# Altium integrated library CONNECTORS - PIN HEADERS.IntLib: 94 symbols (part 1 of 2) (continued)
## PINSTRIP-HDR-SINGLE-11pin
designator J?, comment 9-146285-0  (value not drawn)
11 Pin Header, Single row, 2.54mm pitch, Unshrouded Pin Strip, Vertical; Manufacturer: TE Connectivity; Part Number: 11/40 of 9-146285-0; Pitch: 0.100" (2.54mm); Rows: 1; Mates With (PCB): 5-534237-9; Mates With (Wire housing): 50-57-9011 (MOLEX Part, Uses crimp terminal series 70058, 71851, 70021); Connector Height: 320 mil; Mounting Type: Through Hole; PackageDescription: Pin header; 2.54mm pitch; Pins: 11; Supplier 1: Digi-Key; Supplier 2: Newark; Supplier 3: Mouser; Supplier Part Number 1: A32700-40-ND; Supplier Part Number 2: 16M3463; Supplier Part Number 3: 571-9-146285-0
footprint PINSTRIP-SINGLE-11PIN-.1 (2.54mm (0.100") Pitch, Through Hole, Single Row, Vertical, 11 pin)
3D model Pinstrip-100mil-SINGLE_HDR-11pin (PCB3D Model)
pins: 1, 2, 3, 4, 5, 6, 7, 8, 9, 10, 11
text: PINSTRIP; HEADER

## PINSTRIP-HDR-SINGLE-12pin
designator J?, comment 9-146285-0  (value not drawn)
12 Pin Header, Single row, 2.54mm pitch, Unshrouded Pin Strip, Vertical; Manufacturer: TE Connectivity; Part Number: 12/40 of 9-146285-0; Pitch: 0.100" (2.54mm); Rows: 1; Mates With (PCB): 6-534237-0; Mates With (Wire housing): 50-57-9012 (MOLEX Part, Uses crimp terminal series 70058, 71851, 70021); Connector Height: 320 mil; Mounting Type: Through Hole; PackageDescription: Pin header; 2.54mm pitch; Pins: 12; Supplier 1: Digi-Key; Supplier 2: Newark; Supplier 3: Mouser; Supplier Part Number 1: A32700-40-ND; Supplier Part Number 2: 16M3463; Supplier Part Number 3: 571-9-146285-0
footprint PINSTRIP-SINGLE-12PIN-.1 (2.54mm (0.100") Pitch, Through Hole, Single Row, Vertical, 12 pin)
3D model Pinstrip-100mil-SINGLE_HDR-12pin (PCB3D Model)
pins: 1, 2, 3, 4, 5, 6, 7, 8, 9, 10, 11, 12
text: HEADER; PINSTRIP

## PINSTRIP-HDR-SINGLE-13pin
designator J?, comment 9-146285-0  (value not drawn)
13 Pin Header, Single row, 2.54mm pitch, Unshrouded Pin Strip, Vertical; Manufacturer: TE Connectivity; Part Number: 13/40 of 9-146285-0; Pitch: 0.100" (2.54mm); Rows: 1; Mates With (PCB): 6-534237-1; Mates With (Wire housing): 50-57-9013 (MOLEX Part, Uses crimp terminal series 70058, 71851, 70021); Connector Height: 320 mil; Mounting Type: Through Hole; PackageDescription: Pin header; 2.54mm pitch; Pins: 13; Supplier 1: Digi-Key; Supplier 2: Newark; Supplier 3: Mouser; Supplier Part Number 1: A32700-40-ND; Supplier Part Number 2: 16M3463; Supplier Part Number 3: 571-9-146285-0
footprint PINSTRIP-SINGLE-13PIN-.1 (2.54mm (0.100") Pitch, Through Hole, Single Row, Vertical, 13 pin)
3D model Pinstrip-100mil-SINGLE_HDR-13pin (PCB3D Model)
pins: 1, 2, 3, 4, 5, 6, 7, 8, 9, 10, 11, 12, 13
text: HEADER; PINSTRIP

## PINSTRIP-HDR-SINGLE-14pin
designator J?, comment 9-146285-0  (value not drawn)
14 Pin Header, Single row, 2.54mm pitch, Unshrouded Pin Strip, Vertical; Manufacturer: TE Connectivity; Part Number: 14/40 of 9-146285-0; Pitch: 0.100" (2.54mm); Rows: 1; Mates With (PCB): 6-534237-2; Mates With (Wire housing): 50-57-9014 (MOLEX Part, Uses crimp terminal series 70058, 71851, 70021); Connector Height: 320 mil; Mounting Type: Through Hole; PackageDescription: Pin header; 2.54mm pitch; Pins: 14; Supplier 1: Digi-Key; Supplier 2: Newark; Supplier 3: Mouser; Supplier Part Number 1: A32700-40-ND; Supplier Part Number 2: 16M3463; Supplier Part Number 3: 571-9-146285-0
footprint PINSTRIP-SINGLE-14PIN-.1 (2.54mm (0.100") Pitch, Through Hole, Single Row, Vertical, 14 pin)
3D model Pinstrip-100mil-SINGLE_HDR-14pin (PCB3D Model)
pins: 1, 2, 3, 4, 5, 6, 7, 8, 9, 10, 11, 12, 13, 14
text: HEADER; PINSTRIP

## PINSTRIP-HDR-SINGLE-15pin
designator J?, comment 9-146285-0  (value not drawn)
15 Pin Header, Single row, 2.54mm pitch, Unshrouded Pin Strip, Vertical; Manufacturer: TE Connectivity; Part Number: 15/40 of 9-146285-0; Pitch: 0.100" (2.54mm); Rows: 1; Mates With (PCB): 6-534237-3; Mates With (Wire housing): 50-57-9015 (MOLEX Part, Uses crimp terminal series 70058, 71851, 70021); Connector Height: 320 mil; Mounting Type: Through Hole; PackageDescription: Pin header; 2.54mm pitch; Pins: 15; Supplier 1: Digi-Key; Supplier 2: Newark; Supplier 3: Mouser; Supplier Part Number 1: A32700-40-ND; Supplier Part Number 2: 16M3463; Supplier Part Number 3: 571-9-146285-0
footprint PINSTRIP-SINGLE-15PIN-.1 (2.54mm (0.100") Pitch, Through Hole, Single Row, Vertical, 15 pin)
3D model Pinstrip-100mil-SINGLE_HDR-15pin (PCB3D Model)
pins: 1, 2, 3, 4, 5, 6, 7, 8, 9, 10, 11, 12, 13, 14, 15
text: HEADER; PINSTRIP

## PINSTRIP-HDR-SINGLE-16pin
designator J?, comment 9-146285-0  (value not drawn)
16 Pin Header, Single row, 2.54mm pitch, Unshrouded Pin Strip, Vertical; Manufacturer: TE Connectivity; Part Number: 16/40 of 9-146285-0; Pitch: 0.100" (2.54mm); Rows: 1; Mates With (PCB): 6-534237-4; Mates With (Wire housing): 50-57-9016 (MOLEX Part, Uses crimp terminal series 70058, 71851, 70021); Connector Height: 320 mil; Mounting Type: Through Hole; PackageDescription: Pin header; 2.54mm pitch; Pins: 16; Supplier 1: Digi-Key; Supplier 2: Newark; Supplier 3: Mouser; Supplier Part Number 1: A32700-40-ND; Supplier Part Number 2: 16M3463; Supplier Part Number 3: 571-9-146285-0
footprint PINSTRIP-SINGLE-16PIN-.1 (2.54mm (0.100") Pitch, Through Hole, Single Row, Vertical, 16 pin)
3D model Pinstrip-100mil-SINGLE_HDR-16pin (PCB3D Model)
pins: 1, 2, 3, 4, 5, 6, 7, 8, 9, 10, 11, 12, 13, 14, 15, 16
text: HEADER; PINSTRIP

## PINSTRIP-HDR-SINGLE-17pin
designator J?, comment 9-146285-0  (value not drawn)
17 Pin Header, Single row, 2.54mm pitch, Unshrouded Pin Strip, Vertical; Manufacturer: TE Connectivity; Part Number: 17/40 of 9-146285-0; Pitch: 0.100" (2.54mm); Rows: 1; Mates With (PCB): 6-534237-5; Mates With (Wire housing): 50-57-9017 (MOLEX Part, Uses crimp terminal series 70058, 71851, 70021); Connector Height: 320 mil; Mounting Type: Through Hole; PackageDescription: Pin header; 2.54mm pitch; Pins: 17; Supplier 1: Digi-Key; Supplier 2: Newark; Supplier 3: Mouser; Supplier Part Number 1: A32700-40-ND; Supplier Part Number 2: 16M3463; Supplier Part Number 3: 571-9-146285-0
footprint PINSTRIP-SINGLE-17PIN-.1 (2.54mm (0.100") Pitch, Through Hole, Single Row, Vertical, 17 pin)
3D model Pinstrip-100mil-SINGLE_HDR-17pin (PCB3D Model)
pins: 1, 2, 3, 4, 5, 6, 7, 8, 9, 10, 11, 12, 13, 14, 15, 16, 17
text: HEADER; PINSTRIP

## PINSTRIP-HDR-SINGLE-18pin
designator J?, comment 9-146285-0  (value not drawn)
18 Pin Header, Single row, 2.54mm pitch, Unshrouded Pin Strip, Vertical; Manufacturer: TE Connectivity; Part Number: 18/40 of 9-146285-0; Pitch: 0.100" (2.54mm); Rows: 1; Mates With (PCB): 6-534237-6; Mates With (Wire housing): 50-57-9018 (MOLEX Part, Uses crimp terminal series 70058, 71851, 70021); Connector Height: 320 mil; Mounting Type: Through Hole; PackageDescription: Pin header; 2.54mm pitch; Pins: 18; Supplier 1: Digi-Key; Supplier 2: Newark; Supplier 3: Mouser; Supplier Part Number 1: A32700-40-ND; Supplier Part Number 2: 16M3463; Supplier Part Number 3: 571-9-146285-0
footprint PINSTRIP-SINGLE-18PIN-.1 (2.54mm (0.100") Pitch, Through Hole, Single Row, Vertical, 18 pin)
3D model Pinstrip-100mil-SINGLE_HDR-18pin (PCB3D Model)
pins: 1, 2, 3, 4, 5, 6, 7, 8, 9, 10, 11, 12, 13, 14, 15, 16, 17, 18
text: HEADER; PINSTRIP

## PINSTRIP-HDR-SINGLE-19pin
designator J?, comment 9-146285-0  (value not drawn)
19 Pin Header, Single row, 2.54mm pitch, Unshrouded Pin Strip, Vertical; Manufacturer: TE Connectivity; Part Number: 19/40 of 9-146285-0; Pitch: 0.100" (2.54mm); Rows: 1; Mates With (PCB): 6-534237-7; Mates With (Wire housing): 50-57-9019 (MOLEX Part, Uses crimp terminal series 70058, 71851, 70021); Connector Height: 320 mil; Mounting Type: Through Hole; PackageDescription: Pin header; 2.54mm pitch; Pins: 19; Supplier 1: Digi-Key; Supplier 2: Newark; Supplier 3: Mouser; Supplier Part Number 1: A32700-40-ND; Supplier Part Number 2: 16M3463; Supplier Part Number 3: 571-9-146285-0
footprint PINSTRIP-SINGLE-19PIN-.1 (2.54mm (0.100") Pitch, Through Hole, Single Row, Vertical, 19 pin)
3D model Pinstrip-100mil-SINGLE_HDR-19pin (PCB3D Model)
pins: 1, 2, 3, 4, 5, 6, 7, 8, 9, 10, 11, 12, 13, 14, 15, 16, 17, 18, 19
text: HEADER; PINSTRIP

## PINSTRIP-HDR-SINGLE-20pin
designator J?, comment 9-146285-0  (value not drawn)
20 Pin Header, Single row, 2.54mm pitch, Unshrouded Pin Strip, Vertical; Manufacturer: TE Connectivity; Part Number: 20/40 of 9-146285-0; Pitch: 0.100" (2.54mm); Rows: 1; Mates With (PCB): 6-534237-8; Mates With (Wire housing): 50-57-9020 (MOLEX Part, Uses crimp terminal series 70058, 71851, 70021); Connector Height: 320 mil; Mounting Type: Through Hole; PackageDescription: Pin header; 2.54mm pitch; Pins: 20; Supplier 1: Digi-Key; Supplier 2: Newark; Supplier 3: Mouser; Supplier Part Number 1: A32700-40-ND; Supplier Part Number 2: 16M3463; Supplier Part Number 3: 571-9-146285-0
footprint PINSTRIP-SINGLE-20PIN-.1 (2.54mm (0.100") Pitch, Through Hole, Single Row, Vertical, 20 pin)
3D model Pinstrip-100mil-SINGLE_HDR-20pin (PCB3D Model)
pins: 1, 2, 3, 4, 5, 6, 7, 8, 9, 10, 11, 12, 13, 14, 15, 16, 17, 18, 19, 20
text: HEADER; PINSTRIP

## PINSTRIP-HDR-SINGLE-21pin
designator J?, comment 9-146285-0  (value not drawn)
21 Pin Header, Single row, 2.54mm pitch, Unshrouded Pin Strip, Vertical; Manufacturer: TE Connectivity; Part Number: 21/40 of 9-146285-0; Pitch: 0.100" (2.54mm); Rows: 1; Mates With (PCB): 6-534237-9; Mates With (Wire housing): 50-57-9021 (MOLEX Part, Uses crimp terminal series 70058, 71851, 70021); Connector Height: 320 mil; Mounting Type: Through Hole; PackageDescription: Pin header; 2.54mm pitch; Pins: 21; Supplier 1: Digi-Key; Supplier 2: Newark; Supplier 3: Mouser; Supplier Part Number 1: A32700-40-ND; Supplier Part Number 2: 16M3463; Supplier Part Number 3: 571-9-146285-0
footprint PINSTRIP-SINGLE-21PIN-.1 (2.54mm (0.100") Pitch, Through Hole, Single Row, Vertical, 21 pin)
3D model Pinstrip-100mil-SINGLE_HDR-21pin (PCB3D Model)
pins: 1, 2, 3, 4, 5, 6, 7, 8, 9, 10, 11, 12, 13, 14, 15, 16, 17, 18, 19, 20, 21
text: HEADER; PINSTRIP

## PINSTRIP-HDR-SINGLE-22pin
designator J?, comment 9-146285-0  (value not drawn)
22 Pin Header, Single row, 2.54mm pitch, Unshrouded Pin Strip, Vertical; Manufacturer: TE Connectivity; Part Number: 22/40 of 9-146285-0; Pitch: 0.100" (2.54mm); Rows: 1; Mates With (PCB): 7-234237-0; Mates With (Wire housing): 50-57-9022 (MOLEX Part, Uses crimp terminal series 70058, 71851, 70021); Connector Height: 320 mil; Mounting Type: Through Hole; PackageDescription: Pin header; 2.54mm pitch; Pins: 22; Supplier 1: Digi-Key; Supplier 2: Newark; Supplier 3: Mouser; Supplier Part Number 1: A32700-40-ND; Supplier Part Number 2: 16M3463; Supplier Part Number 3: 571-9-146285-0
footprint PINSTRIP-SINGLE-22PIN-.1 (2.54mm (0.100") Pitch, Through Hole, Single Row, Vertical, 22 pin)
3D model Pinstrip-100mil-SINGLE_HDR-22pin (PCB3D Model)
pins: 1, 2, 3, 4, 5, 6, 7, 8, 9, 10, 11, 12, 13, 14, 15, 16, 17, 18, 19, 20, 21, 22
text: HEADER; PINSTRIP

## PINSTRIP-HDR-SINGLE-23pin
designator J?, comment 9-146285-0  (value not drawn)
23 Pin Header, Single row, 2.54mm pitch, Unshrouded Pin Strip, Vertical; Manufacturer: TE Connectivity; Part Number: 23/40 of 9-146285-0; Pitch: 0.100" (2.54mm); Rows: 1; Mates With (PCB): 7-234237-1; Mates With (Wire housing): 50-57-9023 (MOLEX Part, Uses crimp terminal series 70058, 71851, 70021); Connector Height: 320 mil; Mounting Type: Through Hole; PackageDescription: Pin header; 2.54mm pitch; Pins: 23; Supplier 1: Digi-Key; Supplier 2: Newark; Supplier 3: Mouser; Supplier Part Number 1: A32700-40-ND; Supplier Part Number 2: 16M3463; Supplier Part Number 3: 571-9-146285-0
footprint PINSTRIP-SINGLE-23PIN-.1 (2.54mm (0.100") Pitch, Through Hole, Single Row, Vertical, 23 pin)
3D model Pinstrip-100mil-SINGLE_HDR-23pin (PCB3D Model)
pins: 1, 2, 3, 4, 5, 6, 7, 8, 9, 10, 11, 12, 13, 14, 15, 16, 17, 18, 19, 20, 21, 22, 23
text: HEADER; PINSTRIP

## PINSTRIP-HDR-SINGLE-24pin
designator J?, comment 9-146285-0  (value not drawn)
24 Pin Header, Single row, 2.54mm pitch, Unshrouded Pin Strip, Vertical; Manufacturer: TE Connectivity; Part Number: 24/40 of 9-146285-0; Pitch: 0.100" (2.54mm); Rows: 1; Mates With (PCB): 7-234237-2; Mates With (Wire housing): 50-57-9024 (MOLEX Part, Uses crimp terminal series 70058, 71851, 70021); Connector Height: 320 mil; Mounting Type: Through Hole; PackageDescription: Pin header; 2.54mm pitch; Pins: 24; Supplier 1: Digi-Key; Supplier 2: Newark; Supplier 3: Mouser; Supplier Part Number 1: A32700-40-ND; Supplier Part Number 2: 16M3463; Supplier Part Number 3: 571-9-146285-0
footprint PINSTRIP-SINGLE-24PIN-.1 (2.54mm (0.100") Pitch, Through Hole, Single Row, Vertical, 24 pin)
3D model Pinstrip-100mil-SINGLE_HDR-24pin (PCB3D Model)
pins: 1, 2, 3, 4, 5, 6, 7, 8, 9, 10, 11, 12, 13, 14, 15, 16, 17, 18, 19, 20, 21, 22, 23, 24
text: HEADER; PINSTRIP

## PINSTRIP-HDR-SINGLE-25pin
designator J?, comment 9-146285-0  (value not drawn)
25 Pin Header, Single row, 2.54mm pitch, Unshrouded Pin Strip, Vertical; Manufacturer: TE Connectivity; Part Number: 25/40 of 9-146285-0; Pitch: 0.100" (2.54mm); Rows: 1; Mates With (PCB): 7-234237-3; Mates With (Wire housing): 50-57-9025 (MOLEX Part, Uses crimp terminal series 70058, 71851, 70021); Connector Height: 320 mil; Mounting Type: Through Hole; PackageDescription: Pin header; 2.54mm pitch; Pins: 25; Supplier 1: Digi-Key; Supplier 2: Newark; Supplier 3: Mouser; Supplier Part Number 1: A32700-40-ND; Supplier Part Number 2: 16M3463; Supplier Part Number 3: 571-9-146285-0
footprint PINSTRIP-SINGLE-25PIN-.1 (2.54mm (0.100") Pitch, Through Hole, Single Row, Vertical, 25 pin)
3D model Pinstrip-100mil-SINGLE_HDR-25pin (PCB3D Model)
pins: 1, 2, 3, 4, 5, 6, 7, 8, 9, 10, 11, 12, 13, 14, 15, 16, 17, 18, 19, 20, 21, 22, 23, 24, 25
text: HEADER; PINSTRIP

## PINSTRIP-RCPT-DUAL-4pin
designator J?, comment 5-534206-2  (value not drawn)
4 Pin Receptacle, Pin Strip, , Dual row, 2.54mm pitch, Vertical; Manufacturer: TE Connectivity; Pitch: 0.100" (2.54mm); Rows: 2; Mates With (PCB): PINSTRIP-HDR-DUAL-4pin; Connector Height: 320 mil; Mounting Type: Through Hole; PackageDescription: Pin Receptacle; 2.54mm pitch; Part Number: 5-534206-2; Pins: 4; Mates With (Wire housing): N/A; Supplier 1: Newark; Supplier Part Number 1: 16M3163; Supplier 2: Digi-Key; Supplier Part Number 2: A32933-ND; Supplier 3: Mouser; Supplier Part Number 3: 571-5-534206-2
footprint PINSTRIP-DUAL-4PIN-.1 (2.54mm (0.100") pitch, Through Hole, Dual Row, Vertical, 4 pin)
3D model Pinstrip-100mil-DUAL-RECP-4pin (PCB3D Model)
pins: 1, 2, 3, 4
text: PINSTRIP; RECEPTACLE

## PINSTRIP-RCPT-DUAL-6pin
designator J?, comment 5-534206-3  (value not drawn)
6 Pin Receptacle, Pin Strip, , Dual row, 2.54mm pitch, Vertical; Manufacturer: TE Connectivity; Pitch: 0.100" (2.54mm); Rows: 2; Mates With (PCB): PINSTRIP-HDR-DUAL-6pin; Connector Height: 320 mil; Mounting Type: Through Hole; PackageDescription: Pin Receptacle; 2.54mm pitch; Part Number: 5-534206-3; Pins: 6; Mates With (Wire housing): N/A; Supplier 1: Newark; Supplier Part Number 1: 52K3740; Supplier 2: Digi-Key; Supplier Part Number 2: A32934-ND; Supplier 3: Mouser; Supplier Part Number 3: 571-5-534206-3
footprint PINSTRIP-DUAL-6PIN-.1 (2.54mm (0.100") Pitch Through Hole, Dual Row, Vertical, 6 pin)
3D model Pinstrip-100mil-DUAL-RECP-6pin (PCB3D Model)
pins: 1, 2, 3, 4, 5, 6
text: RECEPTACLE; PINSTRIP

## PINSTRIP-RCPT-DUAL-8pin
designator J?, comment 5-534206-4  (value not drawn)
8 Pin Receptacle, Pin Strip, , Dual row, 2.54mm pitch, Vertical; Manufacturer: TE Connectivity; Pitch: 0.100" (2.54mm); Rows: 2; Mates With (PCB): PINSTRIP-HDR-DUAL-8pin; Connector Height: 320 mil; Mounting Type: Through Hole; PackageDescription: Pin Receptacle; 2.54mm pitch; Part Number: 5-534206-4; Pins: 8; Mates With (Wire housing): N/A; Supplier 1: Digi-Key; Supplier Part Number 1: A32935-ND; Supplier 2: Mouser; Supplier Part Number 2: 571-5-534206-4; Supplier 3: Newark; Supplier Part Number 3: 52K3741
footprint PINSTRIP-DUAL-8PIN-.1 (2.54mm (0.100") Pitch, Through Hole, Dual Row, Vertical, 8 pin)
3D model Pinstrip-100mil-DUAL-RECP-8pin (PCB3D Model)
pins: 1, 2, 3, 4, 5, 6, 7, 8
text: PINSTRIP; RECEPTACLE

## PINSTRIP-RCPT-DUAL-10pin
designator J?, comment 5-534206-5  (value not drawn)
10 Pin Receptacle, Pin Strip, , Dual row, 2.54mm pitch, Vertical; Manufacturer: TE Connectivity; Pitch: 0.100" (2.54mm); Rows: 2; Mates With (PCB): PINSTRIP-HDR-DUAL-10pin; Connector Height: 320 mil; Mounting Type: Through Hole; PackageDescription: Pin Receptacle; 2.54mm pitch; Part Number: 5-534206-5; Pins: 10; Mates With (Wire housing): N/A; Supplier 1: Digi-Key; Supplier Part Number 1: A32936-ND; Supplier 2: Mouser; Supplier Part Number 2: 571-5-534206-5; Supplier 3: Newark; Supplier Part Number 3: 52K3742
footprint PINSTRIP-DUAL-10PIN-.1 (2.54mm (0.100") Pitch, Through Hole, Dual Row, Vertical, 10 pin)
3D model Pinstrip-100mil-DUAL-RECP-10pin (PCB3D Model)
pins: 1, 2, 3, 4, 5, 6, 7, 8, 9, 10
text: PINSTRIP; RECEPTACLE

## PINSTRIP-RCPT-DUAL-12pin
designator J?, comment 5-534206-6  (value not drawn)
12 Pin Receptacle, Pin Strip, , Dual row, 2.54mm pitch, Vertical; Manufacturer: TE Connectivity; Pitch: 0.100" (2.54mm); Rows: 2; Mates With (PCB): PINSTRIP-HDR-DUAL-12pin; Connector Height: 320 mil; Mounting Type: Through Hole; PackageDescription: Pin Receptacle; 2.54mm pitch; Part Number: 5-534206-6; Pins: 12; Mates With (Wire housing): N/A; Supplier 1: Mouser; Supplier Part Number 1: 571-5-534206-6; Supplier 2: Digi-Key; Supplier Part Number 2: A32937-ND; Supplier 3: Newark; Supplier Part Number 3: 52K3743
footprint PINSTRIP-DUAL-12PIN-.1 (2.54mm (0.100") Pitch, Through Hole, Dual Row, Vertical, 12 pin)
3D model Pinstrip-100mil-DUAL-RECP-12pin (PCB3D Model)
pins: 1, 2, 3, 4, 5, 6, 7, 8, 9, 10, 11, 12
text: PINSTRIP; RECEPTACLE

## PINSTRIP-RCPT-DUAL-14pin
designator J?, comment 5-534206-7  (value not drawn)
14 Pin Receptacle, Pin Strip, , Dual row, 2.54mm pitch, Vertical; Manufacturer: TE Connectivity; Pitch: 0.100" (2.54mm); Rows: 2; Mates With (PCB): PINSTRIP-HDR-DUAL-14pin; Connector Height: 320 mil; Mounting Type: Through Hole; PackageDescription: Pin Receptacle; 2.54mm pitch; Part Number: 5-534206-7; Pins: 14; Mates With (Wire housing): N/A; Supplier 1: Digi-Key; Supplier Part Number 1: A32938-ND; Supplier 2: Newark; Supplier Part Number 2: 67K2492; Supplier 3: Mouser; Supplier Part Number 3: 571-5-534206-7
footprint PINSTRIP-DUAL-14PIN-.1 (2.54mm (0.100") Pitch, Through Hole, Dual Row, Vertical, 14 pin)
3D model Pinstrip-100mil-DUAL-RECP-14pin (PCB3D Model)
pins: 1, 2, 3, 4, 5, 6, 7, 8, 9, 10, 11, 12, 13, 14
text: PINSTRIP; RECEPTACLE

## PINSTRIP-RCPT-DUAL-16pin
designator J?, comment 5-534206-8  (value not drawn)
16 Pin Receptacle, Pin Strip, , Dual row, 2.54mm pitch, Vertical; Manufacturer: TE Connectivity; Pitch: 0.100" (2.54mm); Rows: 2; Mates With (PCB): PINSTRIP-HDR-DUAL-16pin; Connector Height: 320 mil; Mounting Type: Through Hole; PackageDescription: Pin Receptacle; 2.54mm pitch; Part Number: 5-534206-8; Pins: 16; Mates With (Wire housing): N/A; Supplier 1: Digi-Key; Supplier Part Number 1: A32939-ND; Supplier 2: Mouser; Supplier Part Number 2: 571-5-534206-8; Supplier 3: Newark; Supplier Part Number 3: 95F1770
footprint PINSTRIP-DUAL-16PIN-.1 (2.54mm (0.100") Pitch, Through Hole, Dual Row, Vertical, 16 pin)
3D model Pinstrip-100mil-DUAL-RECP-16pin (PCB3D Model)
pins: 1, 2, 3, 4, 5, 6, 7, 8, 9, 10, 11, 12, 13, 14, 15, 16
text: PINSTRIP; RECEPTACLE

## PINSTRIP-RCPT-DUAL-18pin
designator J?, comment 5-534206-9  (value not drawn)
18 Pin Receptacle, Pin Strip, , Dual row, 2.54mm pitch, Vertical; Manufacturer: TE Connectivity; Pitch: 0.100" (2.54mm); Rows: 2; Mates With (PCB): PINSTRIP-HDR-DUAL-18pin; Connector Height: 320 mil; Mounting Type: Through Hole; PackageDescription: Pin Receptacle; 2.54mm pitch; Part Number: 5-534206-9; Pins: 18; Mates With (Wire housing): N/A; Supplier 1: Digi-Key; Supplier Part Number 1: A32940-ND; Supplier 2: Mouser; Supplier Part Number 2: 571-5-534206-9; Supplier 3: Newark; Supplier Part Number 3: 16M3164
footprint PINSTRIP-DUAL-18PIN-.1 (2.54mm (0.100") Pitch, Through Hole, Dual Row, Vertical, 18 pin)
3D model Pinstrip-100mil-DUAL-RECP-18pin (PCB3D Model)
pins: 1, 2, 3, 4, 5, 6, 7, 8, 9, 10, 11, 12, 13, 14, 15, 16, 17, 18
text: PINSTRIP; RECEPTACLE

## PINSTRIP-RCPT-DUAL-20pin
designator J?, comment 6-534206-0  (value not drawn)
20 Pin Receptacle, Pin Strip, , Dual row, 2.54mm pitch, Vertical; Manufacturer: TE Connectivity; Pitch: 0.100" (2.54mm); Rows: 2; Mates With (PCB): PINSTRIP-HDR-DUAL-20pin; Connector Height: 320 mil; Mounting Type: Through Hole; PackageDescription: Pin Receptacle; 2.54mm pitch; Part Number: 6-534206-0; Pins: 20; Mates With (Wire housing): N/A; Supplier 1: Mouser; Supplier Part Number 1: 571-6-534206-0; Supplier 2: Digi-Key; Supplier Part Number 2: A32941-ND; Supplier 3: Newark; Supplier Part Number 3: 52K4455
footprint PINSTRIP-DUAL-20PIN-.1 (2.54mm (0.100") Pitch, Through Hole, Dual Row, Vertical, 20 pin)
3D model Pinstrip-100mil-DUAL-RECP-20pin (PCB3D Model)
pins: 1, 2, 3, 4, 5, 6, 7, 8, 9, 10, 11, 12, 13, 14, 15, 16, 17, 18, 19, 20
text: PINSTRIP; RECEPTACLE

## PINSTRIP-RCPT-DUAL-22pin
designator J?, comment 6-534206-1  (value not drawn)
22 Pin Receptacle, Pin Strip, , Dual row, 2.54mm pitch, Vertical; Manufacturer: TE Connectivity; Pitch: 0.100" (2.54mm); Rows: 2; Mates With (PCB): PINSTRIP-HDR-DUAL-22pin; Connector Height: 320 mil; Mounting Type: Through Hole; PackageDescription: Pin Receptacle; 2.54mm pitch; Part Number: 6-534206-1; Pins: 22; Mates With (Wire housing): N/A; Supplier 1: Digi-Key; Supplier Part Number 1: A114868-ND; Supplier 2: Mouser; Supplier Part Number 2: 571-15342061
footprint PINSTRIP-DUAL-22PIN-.1 (2.54mm (0.100") Pitch, Through Hole, Dual Row, Vertical, 22 pin)
3D model Pinstrip-100mil-DUAL-RECP-22pin (PCB3D Model)
pins: 1, 2, 3, 4, 5, 6, 7, 8, 9, 10, 11, 12, 13, 14, 15, 16, 17, 18, 19, 20, 21, 22
text: PINSTRIP; RECEPTACLE

## PINSTRIP-RCPT-DUAL-24pin
designator J?, comment 6-534206-2  (value not drawn)
24 Pin Receptacle, Pin Strip, , Dual row, 2.54mm pitch, Vertical; Manufacturer: TE Connectivity; Pitch: 0.100" (2.54mm); Rows: 2; Mates With (PCB): PINSTRIP-HDR-DUAL-24pin; Connector Height: 320 mil; Mounting Type: Through Hole; PackageDescription: Pin Receptacle; 2.54mm pitch; Part Number: 6-534206-2; Pins: 24; Mates With (Wire housing): N/A; Supplier 1: Newark; Supplier Part Number 1: 52K4456; Supplier 2: Mouser; Supplier Part Number 2: 571-6-534206-2; Supplier 3: Digi-Key; Supplier Part Number 3: A32942-ND
footprint PINSTRIP-DUAL-24PIN-.1 (2.54mm (0.100") Pitch, Through Hole, Dual Row, Vertical, 24 pin)
3D model Pinstrip-100mil-DUAL-RECP-24pin (PCB3D Model)
pins: 1, 2, 3, 4, 5, 6, 7, 8, 9, 10, 11, 12, 13, 14, 15, 16, 17, 18, 19, 20, 21, 22, 23, 24
text: PINSTRIP; RECEPTACLE

## PINSTRIP-RCPT-DUAL-26pin
designator J?, comment 6-534206-3  (value not drawn)
26 Pin Receptacle, Pin Strip, , Dual row, 2.54mm pitch, Vertical; Manufacturer: TE Connectivity; Pitch: 0.100" (2.54mm); Rows: 2; Mates With (PCB): PINSTRIP-HDR-DUAL-26pin; Connector Height: 320 mil; Mounting Type: Through Hole; PackageDescription: Pin Receptacle; 2.54mm pitch; Part Number: 6-534206-3; Pins: 26; Mates With (Wire housing): N/A; Supplier 1: Digi-Key; Supplier Part Number 1: A32943-ND; Supplier 2: Mouser; Supplier Part Number 2: 571-6-534206-3; Supplier 3: Newark; Supplier Part Number 3: 57K9755
footprint PINSTRIP-DUAL-26PIN-.1 (2.54mm (0.100") Pitch, Through Hole, Dual Row, Vertical, 26 pin)
3D model Pinstrip-100mil-DUAL-RECP-26pin (PCB3D Model)
pins: 1, 2, 3, 4, 5, 6, 7, 8, 9, 10, 11, 12, 13, 14, 15, 16, 17, 18, 19, 20, 21, 22, 23, 24, 25, 26
text: PINSTRIP; RECEPTACLE

## PINSTRIP-RCPT-DUAL-28pin
designator J?, comment 6-534206-4  (value not drawn)
28 Pin Receptacle, Pin Strip, , Dual row, 2.54mm pitch, Vertical; Manufacturer: TE Connectivity; Pitch: 0.100" (2.54mm); Rows: 2; Mates With (PCB): PINSTRIP-HDR-DUAL-28pin; Connector Height: 320 mil; Mounting Type: Through Hole; PackageDescription: Pin Receptacle; 2.54mm pitch; Part Number: 6-534206-4; Pins: 28; Mates With (Wire housing): N/A; Supplier 1: Digi-Key; Supplier Part Number 1: A32944-ND; Supplier 2: Mouser; Supplier Part Number 2: 571-6-534206-4; Supplier 3: Newark; Supplier Part Number 3: 52K3793
footprint PINSTRIP-DUAL-28PIN-.1 (2.54mm (0.100") Pitch, Through Hole, Dual Row, Vertical, 28 pin)
3D model Pinstrip-100mil-DUAL-RECP-28pin (PCB3D Model)
pins: 1, 2, 3, 4, 5, 6, 7, 8, 9, 10, 11, 12, 13, 14, 15, 16, 17, 18, 19, 20, 21, 22, 23, 24, 25, 26, 27, 28
text: PINSTRIP; RECEPTACLE

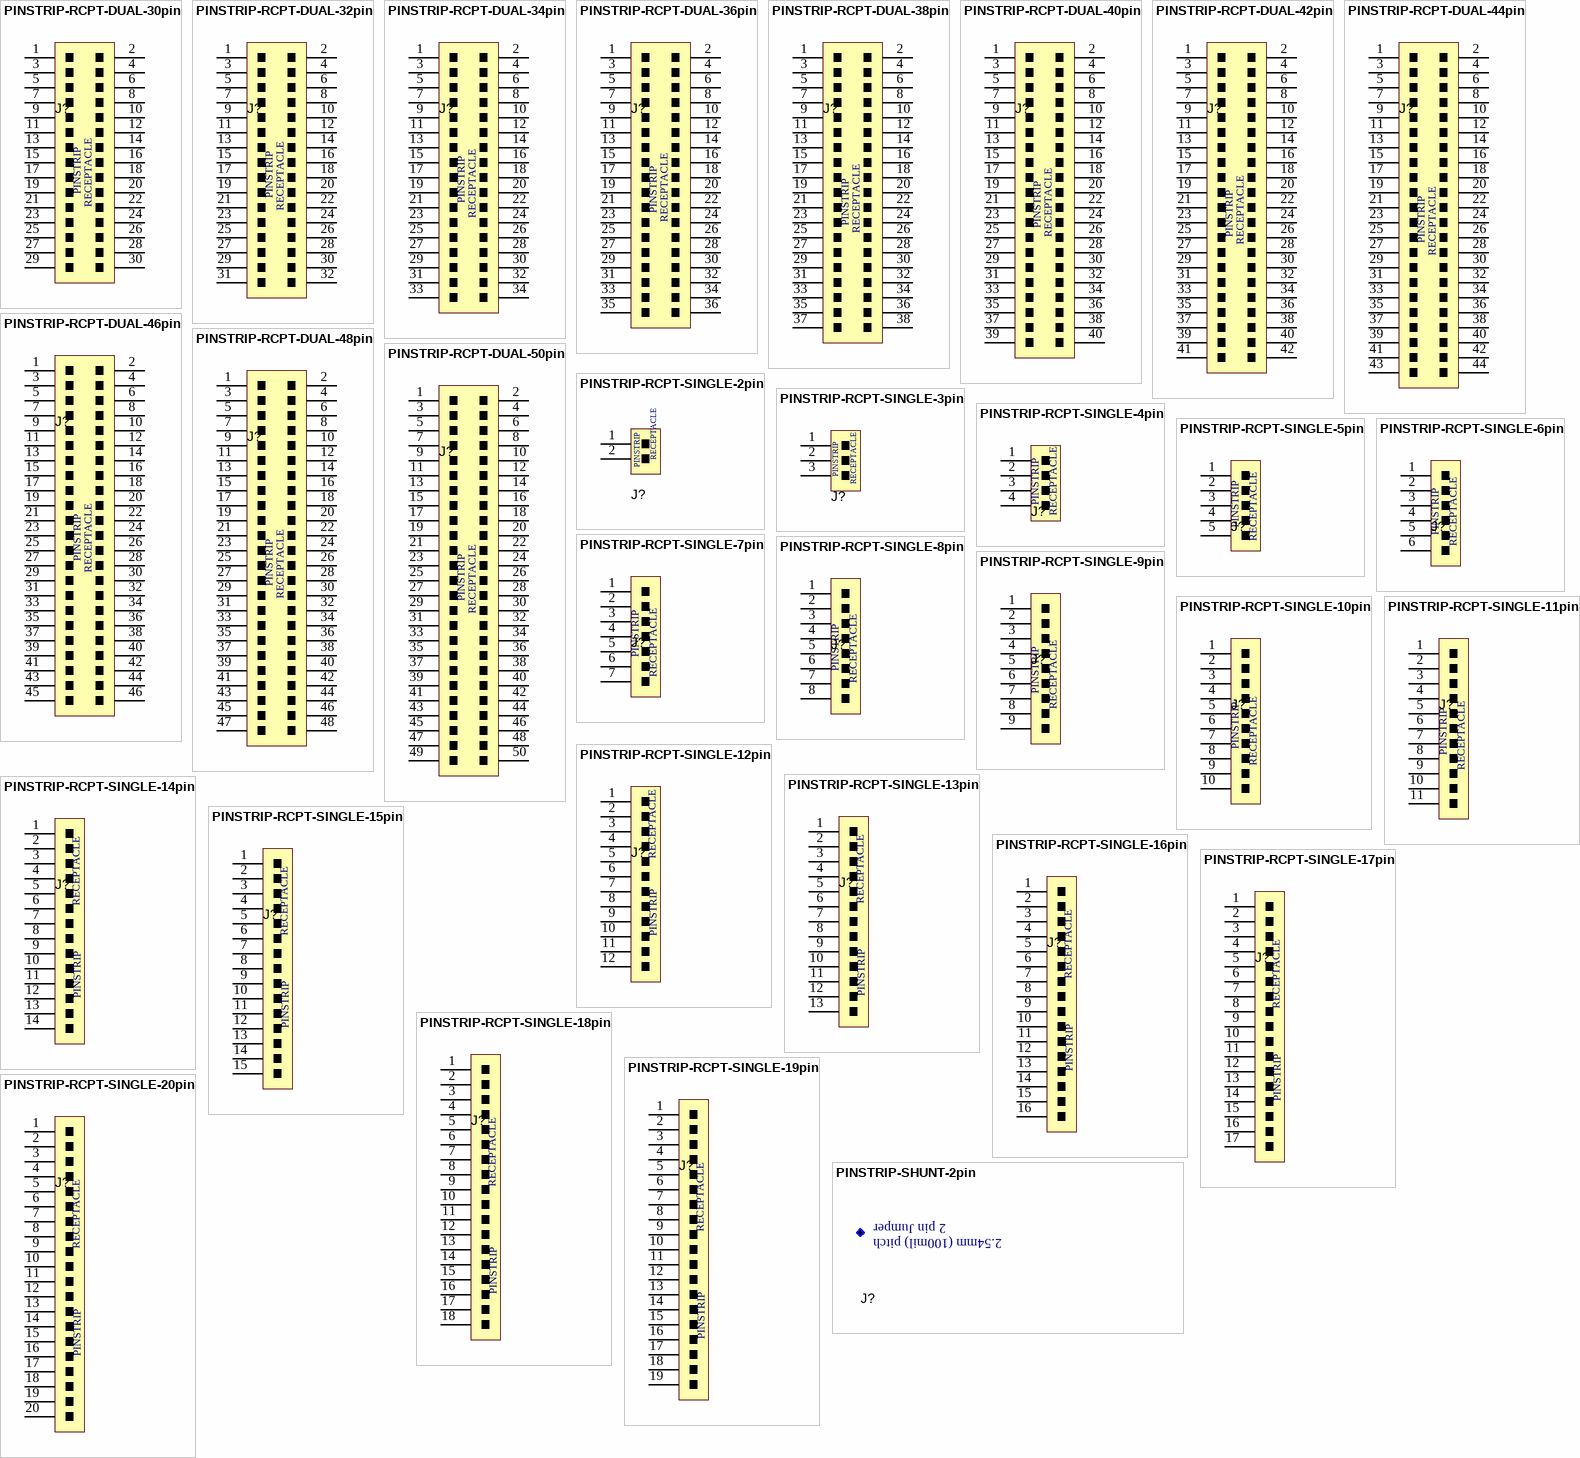
[diagram p3: symbols PINSTRIP-RCPT-DUAL-30pin to PINSTRIP-SHUNT-2pin]

## PINSTRIP-RCPT-DUAL-30pin
designator J?, comment 6-534206-5  (value not drawn)
30 Pin Receptacle, Pin Strip, , Dual row, 2.54mm pitch, Vertical; Manufacturer: TE Connectivity; Pitch: 0.100" (2.54mm); Rows: 2; Mates With (PCB): PINSTRIP-HDR-DUAL-30pin; Connector Height: 320 mil; Mounting Type: Through Hole; PackageDescription: Pin Receptacle; 2.54mm pitch; Part Number: 6-534206-5; Pins: 30; Mates With (Wire housing): N/A; Supplier 1: Newark; Supplier Part Number 1: 52K3794; Supplier 2: Mouser; Supplier Part Number 2: 571-6-534206-5; Supplier 3: Digi-Key; Supplier Part Number 3: A32945-ND
footprint PINSTRIP-DUAL-30PIN-.1 (2.54mm (0.100") Pitch, Through Hole, Dual Row, Vertical, 30 pin)
3D model Pinstrip-100mil-DUAL-RECP-30pin (PCB3D Model)
pins: 1, 2, 3, 4, 5, 6, 7, 8, 9, 10, 11, 12, 13, 14, 15, 16, 17, 18, 19, 20, 21, 22, 23, 24, 25, 26, 27, 28, 29, 30
text: PINSTRIP; RECEPTACLE

## PINSTRIP-RCPT-DUAL-32pin
designator J?, comment 6-534206-6  (value not drawn)
32 Pin Receptacle, Pin Strip, , Dual row, 2.54mm pitch, Vertical; Manufacturer: TE Connectivity; Pitch: 0.100" (2.54mm); Rows: 2; Mates With (PCB): PINSTRIP-HDR-DUAL-32pin; Connector Height: 320 mil; Mounting Type: Through Hole; PackageDescription: Pin Receptacle; 2.54mm pitch; Part Number: 6-534206-6; Pins: 32; Mates With (Wire housing): N/A; Supplier 1: Newark; Supplier Part Number 1: 52K3795; Supplier 2: Digi-Key; Supplier Part Number 2: A32946-ND; Supplier 3: Mouser; Supplier Part Number 3: 571-6-534206-6
footprint PINSTRIP-DUAL-32PIN-.1 (2.54mm (0.100") Pitch, Through Hole, Dual Row, Vertical, 32 pin)
3D model Pinstrip-100mil-DUAL-RECP-32pin (PCB3D Model)
pins: 1, 2, 3, 4, 5, 6, 7, 8, 9, 10, 11, 12, 13, 14, 15, 16, 17, 18, 19, 20, 21, 22, 23, 24, 25, 26, 27, 28, 29, 30, 31, 32
text: PINSTRIP; RECEPTACLE

## PINSTRIP-RCPT-DUAL-34pin
designator J?, comment 6-534206-7  (value not drawn)
34 Pin Receptacle, Pin Strip, , Dual row, 2.54mm pitch, Vertical; Manufacturer: TE Connectivity; Pitch: 0.100" (2.54mm); Rows: 2; Mates With (PCB): PINSTRIP-HDR-DUAL-34pin; Connector Height: 320 mil; Mounting Type: Through Hole; PackageDescription: Pin Receptacle; 2.54mm pitch; Part Number: 6-534206-7; Pins: 34; Mates With (Wire housing): N/A; Supplier 1: Mouser; Supplier Part Number 1: 571-6-534206-7; Supplier 2: Digi-Key; Supplier Part Number 2: A32947-ND; Supplier 3: Newark; Supplier Part Number 3: 52K4457
footprint PINSTRIP-DUAL-34PIN-.1 (2.54mm (0.100") Pitch, Through Hole, Dual Row, Vertical, 34 pin)
3D model Pinstrip-100mil-DUAL-RECP-34pin (PCB3D Model)
pins: 1, 2, 3, 4, 5, 6, 7, 8, 9, 10, 11, 12, 13, 14, 15, 16, 17, 18, 19, 20, 21, 22, 23, 24, 25, 26, 27, 28, 29, 30, 31, 32, 33, 34
text: PINSTRIP; RECEPTACLE

## PINSTRIP-RCPT-DUAL-36pin
designator J?, comment 6-534206-8  (value not drawn)
36 Pin Receptacle, Pin Strip, , Dual row, 2.54mm pitch, Vertical; Manufacturer: TE Connectivity; Pitch: 0.100" (2.54mm); Rows: 2; Mates With (PCB): PINSTRIP-HDR-DUAL-36pin; Connector Height: 320 mil; Mounting Type: Through Hole; PackageDescription: Pin Receptacle; 2.54mm pitch; Part Number: 6-534206-8; Pins: 36; Mates With (Wire housing): N/A; Supplier 1: Digi-Key; Supplier Part Number 1: A32948-ND; Supplier 2: Mouser; Supplier Part Number 2: 571-6-534206-8; Supplier 3: Newark; Supplier Part Number 3: 16M3396
footprint PINSTRIP-DUAL-36PIN-.1 (2.54mm (0.100") Pitch, Through Hole, Dual Row, Vertical, 36 pin)
3D model Pinstrip-100mil-DUAL-RECP-36pin (PCB3D Model)
pins: 1, 2, 3, 4, 5, 6, 7, 8, 9, 10, 11, 12, 13, 14, 15, 16, 17, 18, 19, 20, 21, 22, 23, 24, 25, 26, 27, 28, 29, 30, 31, 32, 33, 34, 35, 36
text: PINSTRIP; RECEPTACLE

## PINSTRIP-RCPT-DUAL-38pin
designator J?, comment 6-534206-9  (value not drawn)
38 Pin Receptacle, Pin Strip, , Dual row, 2.54mm pitch, Vertical; Manufacturer: TE Connectivity; Pitch: 0.100" (2.54mm); Rows: 2; Mates With (PCB): PINSTRIP-HDR-DUAL-38pin; Connector Height: 320 mil; Mounting Type: Through Hole; PackageDescription: Pin Receptacle; 2.54mm pitch; Part Number: 6-534206-9; Pins: 38; Mates With (Wire housing): N/A; Supplier 1: Newark; Supplier Part Number 1: 16M3397; Supplier 2: Mouser; Supplier Part Number 2: 571-6-534206-9; Supplier 3: Digi-Key; Supplier Part Number 3: 6-534206-9-ND
footprint PINSTRIP-DUAL-38PIN-.1 (2.54mm (0.100") Pitch, Through Hole, Dual Row, Vertical, 38 pin)
3D model Pinstrip-100mil-DUAL-RECP-38pin (PCB3D Model)
pins: 1, 2, 3, 4, 5, 6, 7, 8, 9, 10, 11, 12, 13, 14, 15, 16, 17, 18, 19, 20, 21, 22, 23, 24, 25, 26, 27, 28, 29, 30, 31, 32, 33, 34, 35, 36, 37, 38
text: PINSTRIP; RECEPTACLE

## PINSTRIP-RCPT-DUAL-40pin
designator J?, comment 7-534206-0  (value not drawn)
40 Pin Receptacle, Pin Strip, , Dual row, 2.54mm pitch, Vertical; Manufacturer: TE Connectivity; Pitch: 0.100" (2.54mm); Rows: 2; Mates With (PCB): PINSTRIP-HDR-DUAL-40pin; Connector Height: 320 mil; Mounting Type: Through Hole; PackageDescription: Pin Receptacle; 2.54mm pitch; Part Number: 7-534206-0; Pins: 40; Mates With (Wire housing): N/A; Supplier 1: Newark; Supplier Part Number 1: 52K4540; Supplier 2: Mouser; Supplier Part Number 2: 571-7-534206-0; Supplier 3: Digi-Key; Supplier Part Number 3: A32949-ND
footprint PINSTRIP-DUAL-40PIN-.1 (2.54mm (0.100") Pitch, Through Hole, Dual Row, Vertical, 40 pin)
3D model Pinstrip-100mil-DUAL-RECP-40pin (PCB3D Model)
pins: 1, 2, 3, 4, 5, 6, 7, 8, 9, 10, 11, 12, 13, 14, 15, 16, 17, 18, 19, 20, 21, 22, 23, 24, 25, 26, 27, 28, 29, 30, 31, 32, 33, 34, 35, 36, 37, 38, 39, 40
text: PINSTRIP; RECEPTACLE

## PINSTRIP-RCPT-DUAL-42pin
designator J?, comment 7-534206-1  (value not drawn)
42 Pin Receptacle, Pin Strip, , Dual row, 2.54mm pitch, Vertical; Manufacturer: TE Connectivity; Pitch: 0.100" (2.54mm); Rows: 2; Mates With (PCB): PINSTRIP-HDR-DUAL-42pin; Connector Height: 320 mil; Mounting Type: Through Hole; PackageDescription: Pin Receptacle; 2.54mm pitch; Part Number: 7-534206-1; Pins: 42; Mates With (Wire housing): N/A; Supplier 1: Mouser; Supplier Part Number 1: 571-7-534206-1; Supplier 2: Digi-Key; Supplier Part Number 2: 7-534206-1-ND
footprint PINSTRIP-DUAL-42PIN-.1 (2.54mm (0.100") Pitch, Through Hole, Dual Row, Vertical, 42 pin)
3D model Pinstrip-100mil-DUAL-RECP-42pin (PCB3D Model)
pins: 1, 2, 3, 4, 5, 6, 7, 8, 9, 10, 11, 12, 13, 14, 15, 16, 17, 18, 19, 20, 21, 22, 23, 24, 25, 26, 27, 28, 29, 30, 31, 32, 33, 34, 35, 36, 37, 38, 39, 40, 41, 42
text: PINSTRIP; RECEPTACLE

## PINSTRIP-RCPT-DUAL-44pin
designator J?, comment 7-534206-2  (value not drawn)
44 Pin Receptacle, Pin Strip, , Dual row, 2.54mm pitch, Vertical; Manufacturer: TE Connectivity; Pitch: 0.100" (2.54mm); Rows: 2; Mates With (PCB): PINSTRIP-HDR-DUAL-44pin; Connector Height: 320 mil; Mounting Type: Through Hole; PackageDescription: Pin Receptacle; 2.54mm pitch; Part Number: 7-534206-2; Pins: 44; Mates With (Wire housing): N/A; Supplier 1: Mouser; Supplier Part Number 1: 571-7-534206-2; Supplier 2: Digi-Key; Supplier Part Number 2: A32950-ND
footprint PINSTRIP-DUAL-44PIN-.1 (2.54mm (0.100") Pitch, Through Hole, Dual Row, Vertical, 44 pin)
3D model Pinstrip-100mil-DUAL-RECP-44pin (PCB3D Model)
pins: 1, 2, 3, 4, 5, 6, 7, 8, 9, 10, 11, 12, 13, 14, 15, 16, 17, 18, 19, 20, 21, 22, 23, 24, 25, 26, 27, 28, 29, 30, 31, 32, 33, 34, 35, 36, 37, 38, 39, 40, 41, 42, 43, 44
text: PINSTRIP; RECEPTACLE

## PINSTRIP-RCPT-DUAL-46pin
designator J?, comment 7-534206-3  (value not drawn)
46 Pin Receptacle, Pin Strip, , Dual row, 2.54mm pitch, Vertical; Manufacturer: TE Connectivity; Pitch: 0.100" (2.54mm); Rows: 2; Mates With (PCB): PINSTRIP-HDR-DUAL-46pin; Connector Height: 320 mil; Mounting Type: Through Hole; PackageDescription: Pin Receptacle; 2.54mm pitch; Part Number: 7-534206-3; Pins: 46; Mates With (Wire housing): N/A; Supplier 1: Mouser; Supplier Part Number 1: N/A
footprint PINSTRIP-DUAL-46PIN-.1 (2.54mm (0.100") Pitch, Through Hole, Dual Row, Vertical, 49 pin)
3D model Pinstrip-100mil-DUAL-RECP-46pin (PCB3D Model)
pins: 1, 2, 3, 4, 5, 6, 7, 8, 9, 10, 11, 12, 13, 14, 15, 16, 17, 18, 19, 20, 21, 22, 23, 24, 25, 26, 27, 28, 29, 30, 31, 32, 33, 34, 35, 36, 37, 38, 39, 40, 41, 42, 43, 44, 45, 46
text: PINSTRIP; RECEPTACLE

## PINSTRIP-RCPT-DUAL-48pin
designator J?, comment 7-534206-4  (value not drawn)
48 Pin Receptacle, Pin Strip, , Dual row, 2.54mm pitch, Vertical; Manufacturer: TE Connectivity; Pitch: 0.100" (2.54mm); Rows: 2; Mates With (PCB): PINSTRIP-HDR-DUAL-48pin; Connector Height: 320 mil; Mounting Type: Through Hole; PackageDescription: Pin Receptacle; 2.54mm pitch; Part Number: 7-534206-4; Pins: 48; Mates With (Wire housing): N/A; Supplier 1: Mouser; Supplier Part Number 1: 571-2-534206-4
footprint PINSTRIP-DUAL-48PIN-.1 (2.54mm (0.100") Pitch, Through Hole, Dual Row, Vertical, 48 pin)
3D model Pinstrip-100mil-DUAL-RECP-48pin (PCB3D Model)
pins: 1, 2, 3, 4, 5, 6, 7, 8, 9, 10, 11, 12, 13, 14, 15, 16, 17, 18, 19, 20, 21, 22, 23, 24, 25, 26, 27, 28, 29, 30, 31, 32, 33, 34, 35, 36, 37, 38, 39, 40, 41, 42, 43, 44, 45, 46, 47, 48
text: PINSTRIP; RECEPTACLE

## PINSTRIP-RCPT-DUAL-50pin
designator J?, comment 7-534206-5  (value not drawn)
50 Pin Receptacle, Pin Strip, , Dual row, 2.54mm pitch, Vertical; Manufacturer: TE Connectivity; Pitch: 0.100" (2.54mm); Rows: 2; Mates With (PCB): PINSTRIP-HDR-DUAL-50pin; Connector Height: 320 mil; Mounting Type: Through Hole; PackageDescription: Pin Receptacle; 2.54mm pitch; Part Number: 7-534206-5; Pins: 50; Mates With (Wire housing): N/A; Supplier 1: Mouser; Supplier Part Number 1: 571-7-534206-5; Supplier 2: Digi-Key; Supplier Part Number 2: A32951-ND; Supplier 3: Newark; Supplier Part Number 3: 52K4541
footprint PINSTRIP-DUAL-50PIN-.1 (2.54mm (0.100") Pitch, Through Hole, Dual Row, Vertical, 50 pin)
3D model Pinstrip-100mil-DUAL-RECP-50pin (PCB3D Model)
pins: 1, 2, 3, 4, 5, 6, 7, 8, 9, 10, 11, 12, 13, 14, 15, 16, 17, 18, 19, 20, 21, 22, 23, 24, 25, 26, 27, 28, 29, 30, 31, 32, 33, 34, 35, 36, 37, 38, 39, 40, 41, 42, 43, 44, 45, 46, 47, 48, 49, 50
text: PINSTRIP; RECEPTACLE

## PINSTRIP-RCPT-SINGLE-2pin
designator J?, comment 5-534206-1  (value not drawn)
2 Pin Receptacle, Single row, 2.54mm pitch, Vertical; Manufacturer: TE Connectivity; Pitch: 0.100" (2.54mm); Rows: 1; Mates With (PCB): PINSTRIP-HDR-SINGLE-2pin; Connector Height: 320 mil; Mounting Type: Through Hole; PackageDescription: Pin Receptacle; 2.54mm pitch; Part Number: 5-534206-1; Pins: 2; Mates With (Wire housing): N/A; Supplier 1: Newark; Supplier Part Number 1: 16M3162; Supplier 2: Mouser; Supplier Part Number 2: 571-5-534206-1; Supplier 3: Digi-Key; Supplier Part Number 3: A32932-ND
footprint PINSTRIP-SINGLE-2PIN-.1 (2.54mm (0.100") Pitch, Through Hole, Single Row, Vertical, 2 pin)
3D model Pinstrip-100mil-SINGLE-RECP-2pin (PCB3D Model)
pins: 1, 2
text: RECEPTACLE; PINSTRIP

## PINSTRIP-RCPT-SINGLE-3pin
designator J?, comment 5-534237-1  (value not drawn)
3 Pin Receptacle, Single row, 2.54mm pitch, Vertical; Manufacturer: TE Connectivity; Pitch: 0.100" (2.54mm); Rows: 1; Mates With (PCB): PINSTRIP-HDR-SINGLE-3pin; Connector Height: 320 mil; Mounting Type: Through Hole; PackageDescription: Pin Receptacle; 2.54mm pitch; Part Number: 5-534237-1; Pins: 3; Mates With (Wire housing): N/A; Supplier 1: Newark; Supplier Part Number 1: 39P9514; Supplier 2: Mouser; Supplier Part Number 2: 571-5-534237-1; Supplier 3: Digi-Key; Supplier Part Number 3: A32904-ND
footprint PINSTRIP-SINGLE-3PIN-.1 (2.54mm (0.100") Pitch, Through Hole, Single Row, Vertical, 3 pin)
3D model Pinstrip-100mil-SINGLE-RECP-3pin (PCB3D Model)
pins: 1, 2, 3
text: PINSTRIP; RECEPTACLE

## PINSTRIP-RCPT-SINGLE-4pin
designator J?, comment 5-534237-2  (value not drawn)
4 Pin Receptacle, Single row, 2.54mm pitch, Vertical; Manufacturer: TE Connectivity; Pitch: 0.100" (2.54mm); Rows: 1; Mates With (PCB): PINSTRIP-HDR-SINGLE-4pin; Connector Height: 320 mil; Mounting Type: Through Hole; PackageDescription: Pin Receptacle; 2.54mm pitch; Part Number: 5-534237-2; Pins: 4; Mates With (Wire housing): N/A; Supplier 1: Newark; Supplier Part Number 1: 40P9556; Supplier 2: Mouser; Supplier Part Number 2: 571-5-534237-2; Supplier 3: Digi-Key; Supplier Part Number 3: A32905-ND
footprint PINSTRIP-SINGLE-4PIN-.1 (2.54mm (0.100") Pitch, Through Hole, Single Row, Vertical, 4 pin)
3D model Pinstrip-100mil-SINGLE-RECP-4pin (PCB3D Model)
pins: 1, 2, 3, 4
text: PINSTRIP; RECEPTACLE

## PINSTRIP-RCPT-SINGLE-5pin
designator J?, comment 5-534237-3  (value not drawn)
5 Pin Receptacle, Single row, 2.54mm pitch, Vertical; Manufacturer: TE Connectivity; Pitch: 0.100" (2.54mm); Rows: 1; Mates With (PCB): PINSTRIP-HDR-SINGLE-5pin; Connector Height: 320 mil; Mounting Type: Through Hole; PackageDescription: Pin Receptacle; 2.54mm pitch; Part Number: 5-534237-3; Pins: 5; Mates With (Wire housing): N/A; Supplier 1: Mouser; Supplier Part Number 1: 571-5-534237-3; Supplier 2: Newark; Supplier Part Number 2: 18R9351; Supplier 3: Digi-Key; Supplier Part Number 3: A32906-ND
footprint PINSTRIP-SINGLE-5PIN-.1 (2.54mm (0.100") Pitch, Through Hole, Single Row, Vertical, 5 pin)
3D model Pinstrip-100mil-SINGLE-RECP-5pin (PCB3D Model)
pins: 1, 2, 3, 4, 5
text: PINSTRIP; RECEPTACLE

## PINSTRIP-RCPT-SINGLE-6pin
designator J?, comment 5-534237-4  (value not drawn)
6 Pin Receptacle, Single row, 2.54mm pitch, Vertical; Manufacturer: TE Connectivity; Pitch: 0.100" (2.54mm); Rows: 1; Mates With (PCB): PINSTRIP-HDR-SINGLE-6pin; Connector Height: 320 mil; Mounting Type: Through Hole; PackageDescription: Pin Receptacle; 2.54mm pitch; Part Number: 5-534237-4; Pins: 6; Mates With (Wire housing): N/A; Supplier 1: Digi-Key; Supplier Part Number 1: A32907-ND; Supplier 2: Newark; Supplier Part Number 2: 62M8851; Supplier 3: Mouser; Supplier Part Number 3: 571-5-534237-4
footprint PINSTRIP-SINGLE-6PIN-.1 (2.54mm (0.100") Pitch, Through Hole, Single Row, Vertical, 6 pin)
3D model Pinstrip-100mil-SINGLE-RECP-6pin (PCB3D Model)
pins: 1, 2, 3, 4, 5, 6
text: PINSTRIP; RECEPTACLE

## PINSTRIP-RCPT-SINGLE-7pin
designator J?, comment 5-534237-5  (value not drawn)
7 Pin Receptacle, Single row, 2.54mm pitch, Vertical; Manufacturer: TE Connectivity; Pitch: 0.100" (2.54mm); Rows: 1; Mates With (PCB): PINSTRIP-HDR-SINGLE-7pin; Connector Height: 320 mil; Mounting Type: Through Hole; PackageDescription: Pin Receptacle; 2.54mm pitch; Part Number: 5-534237-5; Pins: 7; Mates With (Wire housing): N/A; Supplier 1: Newark; Supplier Part Number 1: 18R9352; Supplier 2: Mouser; Supplier Part Number 2: 571-5-534237-5; Supplier 3: Digi-Key; Supplier Part Number 3: A32908-ND
footprint PINSTRIP-SINGLE-7PIN-.1 (2.54mm (0.100") Pitch, Through Hole, Single Row, Vertical, 7 pin)
3D model Pinstrip-100mil-SINGLE-RECP-7pin (PCB3D Model)
pins: 1, 2, 3, 4, 5, 6, 7
text: PINSTRIP; RECEPTACLE

## PINSTRIP-RCPT-SINGLE-8pin
designator J?, comment 5-534237-6  (value not drawn)
8 Pin Receptacle, Single row, 2.54mm pitch, Vertical; Manufacturer: TE Connectivity; Pitch: 0.100" (2.54mm); Rows: 1; Mates With (PCB): PINSTRIP-HDR-SINGLE-8pin; Connector Height: 320 mil; Mounting Type: Through Hole; PackageDescription: Pin Receptacle; 2.54mm pitch; Part Number: 5-534237-6; Pins: 8; Mates With (Wire housing): N/A; Supplier 1: Newark; Supplier Part Number 1: 52K3745; Supplier 2: Mouser; Supplier Part Number 2: 571-5-534237-6; Supplier 3: Digi-Key; Supplier Part Number 3: A32909-ND
footprint PINSTRIP-SINGLE-8PIN-.1 (2.54mm (0.100") Pitch, Through Hole, Single Row, Vertical, 8 pin)
3D model Pinstrip-100mil-SINGLE-RECP-8pin (PCB3D Model)
pins: 1, 2, 3, 4, 5, 6, 7, 8
text: PINSTRIP; RECEPTACLE

## PINSTRIP-RCPT-SINGLE-9pin
designator J?, comment 5-534237-7  (value not drawn)
9 Pin Receptacle, Single row, 2.54mm pitch, Vertical; Manufacturer: TE Connectivity; Pitch: 0.100" (2.54mm); Rows: 1; Mates With (PCB): PINSTRIP-HDR-SINGLE-9pin; Connector Height: 320 mil; Mounting Type: Through Hole; PackageDescription: Pin Receptacle; 2.54mm pitch; Part Number: 5-534237-7; Pins: 9; Mates With (Wire housing): N/A; Supplier 1: Mouser; Supplier Part Number 1: 571-5-534237-7; Supplier 2: Digi-Key; Supplier Part Number 2: 5-534237-7-ND
footprint PINSTRIP-SINGLE-9PIN-.1 (2.54mm (0.100") Pitch, Through Hole, Single Row, Vertical, 9 pin)
3D model Pinstrip-100mil-SINGLE-RECP-9pin (PCB3D Model)
pins: 1, 2, 3, 4, 5, 6, 7, 8, 9
text: PINSTRIP; RECEPTACLE

## PINSTRIP-RCPT-SINGLE-10pin
designator J?, comment 5-534237-8  (value not drawn)
10 Pin Receptacle, Single row, 2.54mm pitch, Vertical; Manufacturer: TE Connectivity; Pitch: 0.100" (2.54mm); Rows: 1; Mates With (PCB): PINSTRIP-HDR-SINGLE-10pin; Connector Height: 320 mil; Mounting Type: Through Hole; PackageDescription: Pin Receptacle; 2.54mm pitch; Part Number: 5-534237-8; Pins: 10; Mates With (Wire housing): N/A; Supplier 1: Newark; Supplier Part Number 1: 52K3746; Supplier 2: Digi-Key; Supplier Part Number 2: A32910-ND; Supplier 3: Mouser; Supplier Part Number 3: 571-5-534237-8
footprint PINSTRIP-SINGLE-10PIN-.1 (2.54mm (0.100") Pitch, Through Hole, Single Row, Vertical, 10 pin)
3D model Pinstrip-100mil-SINGLE-RECP-10pin (PCB3D Model)
pins: 1, 2, 3, 4, 5, 6, 7, 8, 9, 10
text: PINSTRIP; RECEPTACLE

## PINSTRIP-RCPT-SINGLE-11pin
designator J?, comment 5-534237-9  (value not drawn)
11 Pin Receptacle, Single row, 2.54mm pitch, Vertical; Manufacturer: TE Connectivity; Pitch: 0.100" (2.54mm); Rows: 1; Mates With (PCB): PINSTRIP-HDR-SINGLE-11pin; Connector Height: 320 mil; Mounting Type: Through Hole; PackageDescription: Pin Receptacle; 2.54mm pitch; Part Number: 5-534237-9; Pins: 11; Mates With (Wire housing): N/A; Supplier 1: Digi-Key; Supplier Part Number 1: 5-534237-9-ND; Supplier 2: Newark; Supplier Part Number 2: 18R9354; Supplier 3: Mouser; Supplier Part Number 3: 571-5-534237-9
footprint PINSTRIP-SINGLE-11PIN-.1 (2.54mm (0.100") Pitch, Through Hole, Single Row, Vertical, 11 pin)
3D model Pinstrip-100mil-SINGLE-RECP-11pin (PCB3D Model)
pins: 1, 2, 3, 4, 5, 6, 7, 8, 9, 10, 11
text: PINSTRIP; RECEPTACLE